# Altium footprint library 2.11-TQFP封装.PcbLib: 76 footprints (part 4 of 5) (continued)
## TQFP128 20x20_L [mm] "128脚，体宽：20x20mm, 脚距：0.5mm"
pads (128):
  oval 0.25x1.5 smd: 1(-7.75,-10.525) 2(-7.25,-10.525) 3(-6.75,-10.525) 4(-6.25,-10.525) 5(-5.75,-10.525) 6(-5.25,-10.525) 7(-4.75,-10.525) 8(-4.25,-10.525) 9(-3.75,-10.525) 10(-3.25,-10.525) 11(-2.75,-10.525) 12(-2.25,-10.525) 13(-1.75,-10.525) 14(-1.25,-10.525) 15(-0.75,-10.525) 16(-0.25,-10.525) 17(0.25,-10.525) 18(0.75,-10.525) 19(1.25,-10.525) 20(1.75,-10.525) 21(2.25,-10.525) 22(2.75,-10.525) 23(3.25,-10.525) 24(3.75,-10.525) 25(4.25,-10.525) 26(4.75,-10.525) 27(5.25,-10.525) 28(5.75,-10.525) 29(6.25,-10.525) 30(6.75,-10.525) 31(7.25,-10.525) 32(7.75,-10.525) 65(7.75,10.525) 66(7.25,10.525) 67(6.75,10.525) 68(6.25,10.525) 69(5.75,10.525) 70(5.25,10.525) 71(4.75,10.525) 72(4.25,10.525) 73(3.75,10.525) 74(3.25,10.525) 75(2.75,10.525) 76(2.25,10.525) 77(1.75,10.525) 78(1.25,10.525) 79(0.75,10.525) 80(0.25,10.525) 81(-0.25,10.525) 82(-0.75,10.525) 83(-1.25,10.525) 84(-1.75,10.525) 85(-2.25,10.525) 86(-2.75,10.525) 87(-3.25,10.525) 88(-3.75,10.525) 89(-4.25,10.525) 90(-4.75,10.525) 91(-5.25,10.525) 92(-5.75,10.525) 93(-6.25,10.525) 94(-6.75,10.525) 95(-7.25,10.525) 96(-7.75,10.525)
  oval 1.5x0.25 smd: 33(10.525,-7.75) 34(10.525,-7.25) 35(10.525,-6.75) 36(10.525,-6.25) 37(10.525,-5.75) 38(10.525,-5.25) 39(10.525,-4.75) 40(10.525,-4.25) 41(10.525,-3.75) 42(10.525,-3.25) 43(10.525,-2.75) 44(10.525,-2.25) 45(10.525,-1.75) 46(10.525,-1.25) 47(10.525,-0.75) 48(10.525,-0.25) 49(10.525,0.25) 50(10.525,0.75) 51(10.525,1.25) 52(10.525,1.75) 53(10.525,2.25) 54(10.525,2.75) 55(10.525,3.25) 56(10.525,3.75) 57(10.525,4.25) 58(10.525,4.75) 59(10.525,5.25) 60(10.525,5.75) 61(10.525,6.25) 62(10.525,6.75) 63(10.525,7.25) 64(10.525,7.75) 97(-10.525,7.75) 98(-10.525,7.25) 99(-10.525,6.75) 100(-10.525,6.25) 101(-10.525,5.75) 102(-10.525,5.25) 103(-10.525,4.75) 104(-10.525,4.25) 105(-10.525,3.75) 106(-10.525,3.25) 107(-10.525,2.75) 108(-10.525,2.25) 109(-10.525,1.75) 110(-10.525,1.25) 111(-10.525,0.75) 112(-10.525,0.25) 113(-10.525,-0.25) 114(-10.525,-0.75) 115(-10.525,-1.25) 116(-10.525,-1.75) 117(-10.525,-2.25) 118(-10.525,-2.75) 119(-10.525,-3.25) 120(-10.525,-3.75) 121(-10.525,-4.25) 122(-10.525,-4.75) 123(-10.525,-5.25) 124(-10.525,-5.75) 125(-10.525,-6.25) 126(-10.525,-6.75) 127(-10.525,-7.25) 128(-10.525,-7.75)
Top Overlay:
  circle w0.508: c-8.636,-10.795 r0.127
  circle w0.254: c-7.493,-7.493 r0.889
  lines w0.254: -9.144,-9.144 9.144,-9.144 9.144,9.144 -9.144,9.144 -9.144,-9.144
Mechanical 13:
  circle w0.1: c-8.222,-8.222 r1.016
  lines w0.1: -10,-10 -10,10 10,10 10,-10 -10,-10
Mechanical 15:
  circle w0.05: c0,0 r0.35
  lines w0.05: -0.5,0 0.5,0 ; 0,-0.5 0,0.5
  lines w0.1: -11.557,-11.557 11.557,-11.557 11.557,11.557 -11.557,11.557 -11.557,-11.557
3D body "TQFP128_20x20.STEP": height 1.05, standoff 0, extent -11.002,-11.002 11.002,11.002

## TQFP128 20x20_M [mm] "128脚，体宽：20x20mm, 脚距：0.5mm"
pads (128):
  oval 0.35x2.1 smd: 1(-7.75,-10.754) 2(-7.25,-10.754) 3(-6.75,-10.754) 4(-6.25,-10.754) 5(-5.75,-10.754) 6(-5.25,-10.754) 7(-4.75,-10.754) 8(-4.25,-10.754) 9(-3.75,-10.754) 10(-3.25,-10.754) 11(-2.75,-10.754) 12(-2.25,-10.754) 13(-1.75,-10.754) 14(-1.25,-10.754) 15(-0.75,-10.754) 16(-0.25,-10.754) 17(0.25,-10.754) 18(0.75,-10.754) 19(1.25,-10.754) 20(1.75,-10.754) 21(2.25,-10.754) 22(2.75,-10.754) 23(3.25,-10.754) 24(3.75,-10.754) 25(4.25,-10.754) 26(4.75,-10.754) 27(5.25,-10.754) 28(5.75,-10.754) 29(6.25,-10.754) 30(6.75,-10.754) 31(7.25,-10.754) 32(7.75,-10.754) 65(7.75,10.754) 66(7.25,10.754) 67(6.75,10.754) 68(6.25,10.754) 69(5.75,10.754) 70(5.25,10.754) 71(4.75,10.754) 72(4.25,10.754) 73(3.75,10.754) 74(3.25,10.754) 75(2.75,10.754) 76(2.25,10.754) 77(1.75,10.754) 78(1.25,10.754) 79(0.75,10.754) 80(0.25,10.754) 81(-0.25,10.754) 82(-0.75,10.754) 83(-1.25,10.754) 84(-1.75,10.754) 85(-2.25,10.754) 86(-2.75,10.754) 87(-3.25,10.754) 88(-3.75,10.754) 89(-4.25,10.754) 90(-4.75,10.754) 91(-5.25,10.754) 92(-5.75,10.754) 93(-6.25,10.754) 94(-6.75,10.754) 95(-7.25,10.754) 96(-7.75,10.754)
  oval 2.1x0.35 smd: 33(10.754,-7.75) 34(10.754,-7.25) 35(10.754,-6.75) 36(10.754,-6.25) 37(10.754,-5.75) 38(10.754,-5.25) 39(10.754,-4.75) 40(10.754,-4.25) 41(10.754,-3.75) 42(10.754,-3.25) 43(10.754,-2.75) 44(10.754,-2.25) 45(10.754,-1.75) 46(10.754,-1.25) 47(10.754,-0.75) 48(10.754,-0.25) 49(10.754,0.25) 50(10.754,0.75) 51(10.754,1.25) 52(10.754,1.75) 53(10.754,2.25) 54(10.754,2.75) 55(10.754,3.25) 56(10.754,3.75) 57(10.754,4.25) 58(10.754,4.75) 59(10.754,5.25) 60(10.754,5.75) 61(10.754,6.25) 62(10.754,6.75) 63(10.754,7.25) 64(10.754,7.75) 97(-10.754,7.75) 98(-10.754,7.25) 99(-10.754,6.75) 100(-10.754,6.25) 101(-10.754,5.75) 102(-10.754,5.25) 103(-10.754,4.75) 104(-10.754,4.25) 105(-10.754,3.75) 106(-10.754,3.25) 107(-10.754,2.75) 108(-10.754,2.25) 109(-10.754,1.75) 110(-10.754,1.25) 111(-10.754,0.75) 112(-10.754,0.25) 113(-10.754,-0.25) 114(-10.754,-0.75) 115(-10.754,-1.25) 116(-10.754,-1.75) 117(-10.754,-2.25) 118(-10.754,-2.75) 119(-10.754,-3.25) 120(-10.754,-3.75) 121(-10.754,-4.25) 122(-10.754,-4.75) 123(-10.754,-5.25) 124(-10.754,-5.75) 125(-10.754,-6.25) 126(-10.754,-6.75) 127(-10.754,-7.25) 128(-10.754,-7.75)
Top Overlay:
  circle w0.508: c-8.636,-11.303 r0.127
  circle w0.254: c-7.493,-7.493 r0.889
  lines w0.254: -9.144,-9.144 9.144,-9.144 9.144,9.144 -9.144,9.144 -9.144,-9.144
Mechanical 13:
  circle w0.1: c-8.222,-8.222 r1.016
  lines w0.1: -10,-10 -10,10 10,10 10,-10 -10,-10
Mechanical 15:
  circle w0.05: c0,0 r0.35
  lines w0.05: -0.5,0 0.5,0 ; 0,-0.5 0,0.5
  lines w0.1: -12.065,-12.065 12.065,-12.065 12.065,12.065 -12.065,12.065 -12.065,-12.065
3D body "TQFP128_20x20.STEP": height 1.05, standoff 0, extent -11.002,-11.002 11.002,11.002

## TQFP128 20x20_N [mm] "128脚，体宽：20x20mm, 脚距：0.5mm          淘宝ID:黄晶宝石"
pads (128):
  oval 0.3x1.8 smd: 1(-7.75,-10.576) 2(-7.25,-10.576) 3(-6.75,-10.576) 4(-6.25,-10.576) 5(-5.75,-10.576) 6(-5.25,-10.576) 7(-4.75,-10.576) 8(-4.25,-10.576) 9(-3.75,-10.576) 10(-3.25,-10.576) 11(-2.75,-10.576) 12(-2.25,-10.576) 13(-1.75,-10.576) 14(-1.25,-10.576) 15(-0.75,-10.576) 16(-0.25,-10.576) 17(0.25,-10.576) 18(0.75,-10.576) 19(1.25,-10.576) 20(1.75,-10.576) 21(2.25,-10.576) 22(2.75,-10.576) 23(3.25,-10.576) 24(3.75,-10.576) 25(4.25,-10.576) 26(4.75,-10.576) 27(5.25,-10.576) 28(5.75,-10.576) 29(6.25,-10.576) 30(6.75,-10.576) 31(7.25,-10.576) 32(7.75,-10.576) 65(7.75,10.576) 66(7.25,10.576) 67(6.75,10.576) 68(6.25,10.576) 69(5.75,10.576) 70(5.25,10.576) 71(4.75,10.576) 72(4.25,10.576) 73(3.75,10.576) 74(3.25,10.576) 75(2.75,10.576) 76(2.25,10.576) 77(1.75,10.576) 78(1.25,10.576) 79(0.75,10.576) 80(0.25,10.576) 81(-0.25,10.576) 82(-0.75,10.576) 83(-1.25,10.576) 84(-1.75,10.576) 85(-2.25,10.576) 86(-2.75,10.576) 87(-3.25,10.576) 88(-3.75,10.576) 89(-4.25,10.576) 90(-4.75,10.576) 91(-5.25,10.576) 92(-5.75,10.576) 93(-6.25,10.576) 94(-6.75,10.576) 95(-7.25,10.576) 96(-7.75,10.576)
  oval 1.8x0.3 smd: 33(10.576,-7.75) 34(10.576,-7.25) 35(10.576,-6.75) 36(10.576,-6.25) 37(10.576,-5.75) 38(10.576,-5.25) 39(10.576,-4.75) 40(10.576,-4.25) 41(10.576,-3.75) 42(10.576,-3.25) 43(10.576,-2.75) 44(10.576,-2.25) 45(10.576,-1.75) 46(10.576,-1.25) 47(10.576,-0.75) 48(10.576,-0.25) 49(10.576,0.25) 50(10.576,0.75) 51(10.576,1.25) 52(10.576,1.75) 53(10.576,2.25) 54(10.576,2.75) 55(10.576,3.25) 56(10.576,3.75) 57(10.576,4.25) 58(10.576,4.75) 59(10.576,5.25) 60(10.576,5.75) 61(10.576,6.25) 62(10.576,6.75) 63(10.576,7.25) 64(10.576,7.75) 97(-10.576,7.75) 98(-10.576,7.25) 99(-10.576,6.75) 100(-10.576,6.25) 101(-10.576,5.75) 102(-10.576,5.25) 103(-10.576,4.75) 104(-10.576,4.25) 105(-10.576,3.75) 106(-10.576,3.25) 107(-10.576,2.75) 108(-10.576,2.25) 109(-10.576,1.75) 110(-10.576,1.25) 111(-10.576,0.75) 112(-10.576,0.25) 113(-10.576,-0.25) 114(-10.576,-0.75) 115(-10.576,-1.25) 116(-10.576,-1.75) 117(-10.576,-2.25) 118(-10.576,-2.75) 119(-10.576,-3.25) 120(-10.576,-3.75) 121(-10.576,-4.25) 122(-10.576,-4.75) 123(-10.576,-5.25) 124(-10.576,-5.75) 125(-10.576,-6.25) 126(-10.576,-6.75) 127(-10.576,-7.25) 128(-10.576,-7.75)
Top Overlay:
  circle w0.508: c-8.636,-11.049 r0.127
  circle w0.254: c-7.493,-7.493 r0.889
  lines w0.254: -9.144,-9.144 -9.144,9.144 9.144,9.144 9.144,-9.144 -9.144,-9.144
Mechanical 13:
  circle w0.1: c-8.222,-8.222 r1.016
  lines w0.1: -10,-10 10,-10 10,10 -10,10 -10,-10
Mechanical 15:
  circle w0.05: c0,0 r0.35
  lines w0.05: -0.5,0 0.5,0 ; 0,-0.5 0,0.5
  lines w0.1: -11.684,-11.684 -11.684,11.684 11.684,11.684 11.684,-11.684 -11.684,-11.684
3D body "TQFP128_20x20.STEP": height 1.05, standoff 0, extent -11.002,-11.002 11.002,11.002

## TQFP128-14*14 [mm] "14x14mm, 0.4mm     封装库来自淘宝卖家 ID：黄晶宝石"
pads (128):
  oval 0.23x1.6 smd: 1(-6.2,-7.648) 2(-5.8,-7.648) 3(-5.4,-7.648) 4(-5,-7.648) 5(-4.6,-7.648) 6(-4.2,-7.648) 7(-3.8,-7.648) 8(-3.4,-7.648) 9(-3,-7.648) 10(-2.6,-7.648) 11(-2.2,-7.648) 12(-1.8,-7.648) 13(-1.4,-7.648) 14(-1,-7.648) 15(-0.6,-7.648) 16(-0.2,-7.648) 17(0.2,-7.648) 18(0.6,-7.648) 19(1,-7.648) 20(1.4,-7.648) 21(1.8,-7.648) 22(2.2,-7.648) 23(2.6,-7.648) 24(3,-7.648) 25(3.4,-7.648) 26(3.8,-7.648) 27(4.2,-7.648) 28(4.6,-7.648) 29(5,-7.648) 30(5.4,-7.648) 31(5.8,-7.648) 32(6.2,-7.648) 65(6.2,7.653) 66(5.8,7.653) 67(5.4,7.653) 68(5,7.653) 69(4.6,7.653) 70(4.2,7.653) 71(3.8,7.653) 72(3.4,7.653) 73(3,7.653) 74(2.6,7.653) 75(2.2,7.653) 76(1.8,7.653) 77(1.4,7.653) 78(1,7.653) 79(0.6,7.653) 80(0.2,7.653) 81(-0.2,7.653) 82(-0.6,7.653) 83(-1,7.653) 84(-1.4,7.653) 85(-1.8,7.653) 86(-2.2,7.653) 87(-2.6,7.653) 88(-3,7.653) 89(-3.4,7.653) 90(-3.8,7.653) 91(-4.2,7.653) 92(-4.6,7.653) 93(-5,7.653) 94(-5.4,7.653) 95(-5.8,7.653) 96(-6.2,7.653)
  oval 1.6x0.23 smd: 33(7.651,-6.198) 34(7.651,-5.798) 35(7.651,-5.398) 36(7.651,-4.998) 37(7.651,-4.598) 38(7.651,-4.198) 39(7.651,-3.798) 40(7.651,-3.398) 41(7.651,-2.998) 42(7.651,-2.598) 43(7.651,-2.198) 44(7.651,-1.798) 45(7.651,-1.398) 46(7.651,-0.998) 47(7.651,-0.598) 48(7.651,-0.198) 49(7.651,0.202) 50(7.651,0.602) 51(7.651,1.002) 52(7.651,1.402) 53(7.651,1.802) 54(7.651,2.202) 55(7.651,2.602) 56(7.651,3.002) 57(7.651,3.402) 58(7.651,3.802) 59(7.651,4.202) 60(7.651,4.602) 61(7.651,5.002) 62(7.651,5.402) 63(7.651,5.802) 64(7.651,6.202) 97(-7.651,6.202) 98(-7.651,5.802) 99(-7.651,5.402) 100(-7.651,5.002) 101(-7.651,4.602) 102(-7.651,4.202) 103(-7.651,3.802) 104(-7.651,3.402) 105(-7.651,3.002) 106(-7.651,2.602) 107(-7.651,2.202) 108(-7.651,1.802) 109(-7.651,1.402) 110(-7.651,1.002) 111(-7.651,0.602) 112(-7.651,0.202) 113(-7.651,-0.198) 114(-7.651,-0.598) 115(-7.651,-0.998) 116(-7.651,-1.398) 117(-7.651,-1.798) 118(-7.651,-2.198) 119(-7.651,-2.598) 120(-7.651,-2.998) 121(-7.651,-3.398) 122(-7.651,-3.798) 123(-7.651,-4.198) 124(-7.651,-4.598) 125(-7.651,-4.998) 126(-7.651,-5.398) 127(-7.651,-5.798) 128(-7.651,-6.198)
Top Overlay:
  circle w0.508: c-6.985,-8.001 r0.127
  lines w0.254: -6.096,-6.094 6.096,-6.094 6.096,6.098 -6.096,6.098 -6.096,-6.094
3D body "TQFP128_14x14.STEP": height 1.05, standoff 0, extent -8.002,-8.002 8.002,8.002

## TQFP128-20*20 [mm] "20x20mm, 0.5mm      封装库来自淘宝卖家 ID：黄晶宝石"
pads (128):
  oval 0.3x1.8 smd: 1(-7.75,-10.576) 2(-7.25,-10.576) 3(-6.75,-10.576) 4(-6.25,-10.576) 5(-5.75,-10.576) 6(-5.25,-10.576) 7(-4.75,-10.576) 8(-4.25,-10.576) 9(-3.75,-10.576) 10(-3.25,-10.576) 11(-2.75,-10.576) 12(-2.25,-10.576) 13(-1.75,-10.576) 14(-1.25,-10.576) 15(-0.75,-10.576) 16(-0.25,-10.576) 17(0.25,-10.576) 18(0.75,-10.576) 19(1.25,-10.576) 20(1.75,-10.576) 21(2.25,-10.576) 22(2.75,-10.576) 23(3.25,-10.576) 24(3.75,-10.576) 25(4.25,-10.576) 26(4.75,-10.576) 27(5.25,-10.576) 28(5.75,-10.576) 29(6.25,-10.576) 30(6.75,-10.576) 31(7.25,-10.576) 32(7.75,-10.576) 65(7.75,10.576) 66(7.25,10.576) 67(6.75,10.576) 68(6.25,10.576) 69(5.75,10.576) 70(5.25,10.576) 71(4.75,10.576) 72(4.25,10.576) 73(3.75,10.576) 74(3.25,10.576) 75(2.75,10.576) 76(2.25,10.576) 77(1.75,10.576) 78(1.25,10.576) 79(0.75,10.576) 80(0.25,10.576) 81(-0.25,10.576) 82(-0.75,10.576) 83(-1.25,10.576) 84(-1.75,10.576) 85(-2.25,10.576) 86(-2.75,10.576) 87(-3.25,10.576) 88(-3.75,10.576) 89(-4.25,10.576) 90(-4.75,10.576) 91(-5.25,10.576) 92(-5.75,10.576) 93(-6.25,10.576) 94(-6.75,10.576) 95(-7.25,10.576) 96(-7.75,10.576)
  oval 1.8x0.3 smd: 33(10.576,-7.75) 34(10.576,-7.25) 35(10.576,-6.75) 36(10.576,-6.25) 37(10.576,-5.75) 38(10.576,-5.25) 39(10.576,-4.75) 40(10.576,-4.25) 41(10.576,-3.75) 42(10.576,-3.25) 43(10.576,-2.75) 44(10.576,-2.25) 45(10.576,-1.75) 46(10.576,-1.25) 47(10.576,-0.75) 48(10.576,-0.25) 49(10.576,0.25) 50(10.576,0.75) 51(10.576,1.25) 52(10.576,1.75) 53(10.576,2.25) 54(10.576,2.75) 55(10.576,3.25) 56(10.576,3.75) 57(10.576,4.25) 58(10.576,4.75) 59(10.576,5.25) 60(10.576,5.75) 61(10.576,6.25) 62(10.576,6.75) 63(10.576,7.25) 64(10.576,7.75) 97(-10.576,7.75) 98(-10.576,7.25) 99(-10.576,6.75) 100(-10.576,6.25) 101(-10.576,5.75) 102(-10.576,5.25) 103(-10.576,4.75) 104(-10.576,4.25) 105(-10.576,3.75) 106(-10.576,3.25) 107(-10.576,2.75) 108(-10.576,2.25) 109(-10.576,1.75) 110(-10.576,1.25) 111(-10.576,0.75) 112(-10.576,0.25) 113(-10.576,-0.25) 114(-10.576,-0.75) 115(-10.576,-1.25) 116(-10.576,-1.75) 117(-10.576,-2.25) 118(-10.576,-2.75) 119(-10.576,-3.25) 120(-10.576,-3.75) 121(-10.576,-4.25) 122(-10.576,-4.75) 123(-10.576,-5.25) 124(-10.576,-5.75) 125(-10.576,-6.25) 126(-10.576,-6.75) 127(-10.576,-7.25) 128(-10.576,-7.75)
Top Overlay:
  circle w0.508: c-8.636,-11.049 r0.127
  lines w0.254: -9.144,-9.144 9.144,-9.144 9.144,9.144 -9.144,9.144 -9.144,-9.144
3D body "TQFP128_20x20.STEP": height 1.05, standoff 0, extent -11.002,-11.002 11.002,11.002

## TQFP144 20x20_L [mm] "144脚，体宽：20x20mm, 脚距：0.5mm"
height 1.6
pads (144):
  oval 0.25x1.5 smd: 1(-8.75,-10.525) 2(-8.25,-10.525) 3(-7.75,-10.525) 4(-7.25,-10.525) 5(-6.75,-10.525) 6(-6.25,-10.525) 7(-5.75,-10.525) 8(-5.25,-10.525) 9(-4.75,-10.525) 10(-4.25,-10.525) 11(-3.75,-10.525) 12(-3.25,-10.525) 13(-2.75,-10.525) 14(-2.25,-10.525) 15(-1.75,-10.525) 16(-1.25,-10.525) 17(-0.75,-10.525) 18(-0.25,-10.525) 19(0.25,-10.525) 20(0.75,-10.525) 21(1.25,-10.525) 22(1.75,-10.525) 23(2.25,-10.525) 24(2.75,-10.525) 25(3.25,-10.525) 26(3.75,-10.525) 27(4.25,-10.525) 28(4.75,-10.525) 29(5.25,-10.525) 30(5.75,-10.525) 31(6.25,-10.525) 32(6.75,-10.525) 33(7.25,-10.525) 34(7.75,-10.525) 35(8.25,-10.525) 36(8.75,-10.525) 73(8.75,10.525) 74(8.25,10.525) 75(7.75,10.525) 76(7.25,10.525) 77(6.75,10.525) 78(6.25,10.525) 79(5.75,10.525) 80(5.25,10.525) 81(4.75,10.525) 82(4.25,10.525) 83(3.75,10.525) 84(3.25,10.525) 85(2.75,10.525) 86(2.25,10.525) 87(1.75,10.525) 88(1.25,10.525) 89(0.75,10.525) 90(0.25,10.525) 91(-0.25,10.525) 92(-0.75,10.525) 93(-1.25,10.525) 94(-1.75,10.525) 95(-2.25,10.525) 96(-2.75,10.525) 97(-3.25,10.525) 98(-3.75,10.525) 99(-4.25,10.525) 100(-4.75,10.525) 101(-5.25,10.525) 102(-5.75,10.525) 103(-6.25,10.525) 104(-6.75,10.525) 105(-7.25,10.525) 106(-7.75,10.525) 107(-8.25,10.525) 108(-8.75,10.525)
  oval 1.5x0.25 smd: 37(10.525,-8.75) 38(10.525,-8.25) 39(10.525,-7.75) 40(10.525,-7.25) 41(10.525,-6.75) 42(10.525,-6.25) 43(10.525,-5.75) 44(10.525,-5.25) 45(10.525,-4.75) 46(10.525,-4.25) 47(10.525,-3.75) 48(10.525,-3.25) 49(10.525,-2.75) 50(10.525,-2.25) 51(10.525,-1.75) 52(10.525,-1.25) 53(10.525,-0.75) 54(10.525,-0.25) 55(10.525,0.25) 56(10.525,0.75) 57(10.525,1.25) 58(10.525,1.75) 59(10.525,2.25) 60(10.525,2.75) 61(10.525,3.25) 62(10.525,3.75) 63(10.525,4.25) 64(10.525,4.75) 65(10.525,5.25) 66(10.525,5.75) 67(10.525,6.25) 68(10.525,6.75) 69(10.525,7.25) 70(10.525,7.75) 71(10.525,8.25) 72(10.525,8.75) 109(-10.525,8.75) 110(-10.525,8.25) 111(-10.525,7.75) 112(-10.525,7.25) 113(-10.525,6.75) 114(-10.525,6.25) 115(-10.525,5.75) 116(-10.525,5.25) 117(-10.525,4.75) 118(-10.525,4.25) 119(-10.525,3.75) 120(-10.525,3.25) 121(-10.525,2.75) 122(-10.525,2.25) 123(-10.525,1.75) 124(-10.525,1.25) 125(-10.525,0.75) 126(-10.525,0.25) 127(-10.525,-0.25) 128(-10.525,-0.75) 129(-10.525,-1.25) 130(-10.525,-1.75) 131(-10.525,-2.25) 132(-10.525,-2.75) 133(-10.525,-3.25) 134(-10.525,-3.75) 135(-10.525,-4.25) 136(-10.525,-4.75) 137(-10.525,-5.25) 138(-10.525,-5.75) 139(-10.525,-6.25) 140(-10.525,-6.75) 141(-10.525,-7.25) 142(-10.525,-7.75) 143(-10.525,-8.25) 144(-10.525,-8.75)
Top Overlay:
  circle w0.508: c-9.652,-10.795 r0.127
  circle w0.254: c-7.366,-7.366 r0.889
  lines w0.254: -8.89,-8.89 8.89,-8.89 8.89,8.89 -8.89,8.89 -8.89,-8.89
Mechanical 13:
  circle w0.1: c-9.1,-9.1 r0.5
  lines w0.1: -10,-10 10,-10 10,10 -10,10 -10,-10
Mechanical 15:
  circle w0.05: c0,0 r0.35
  lines w0.05: -0.5,0 0.5,0 ; 0,-0.5 0,0.5
  lines w0.1: -11.557,-11.557 11.557,-11.557 11.557,11.557 -11.557,11.557 -11.557,-11.557
3D body "TQFP144_20x20.STEP": height 1.05, standoff 0, extent -11.002,-11.002 11.002,11.002

## TQFP144 20x20_M [mm] "144脚，体宽：20x20mm, 脚距：0.5mm  淘宝ID:黄晶宝石"
height 1.6
pads (144):
  oval 0.35x2.1 smd: 1(-8.75,-10.754) 2(-8.25,-10.754) 3(-7.75,-10.754) 4(-7.25,-10.754) 5(-6.75,-10.754) 6(-6.25,-10.754) 7(-5.75,-10.754) 8(-5.25,-10.754) 9(-4.75,-10.754) 10(-4.25,-10.754) 11(-3.75,-10.754) 12(-3.25,-10.754) 13(-2.75,-10.754) 14(-2.25,-10.754) 15(-1.75,-10.754) 16(-1.25,-10.754) 17(-0.75,-10.754) 18(-0.25,-10.754) 19(0.25,-10.754) 20(0.75,-10.754) 21(1.25,-10.754) 22(1.75,-10.754) 23(2.25,-10.754) 24(2.75,-10.754) 25(3.25,-10.754) 26(3.75,-10.754) 27(4.25,-10.754) 28(4.75,-10.754) 29(5.25,-10.754) 30(5.75,-10.754) 31(6.25,-10.754) 32(6.75,-10.754) 33(7.25,-10.754) 34(7.75,-10.754) 35(8.25,-10.754) 36(8.75,-10.754) 73(8.75,10.754) 74(8.25,10.754) 75(7.75,10.754) 76(7.25,10.754) 77(6.75,10.754) 78(6.25,10.754) 79(5.75,10.754) 80(5.25,10.754) 81(4.75,10.754) 82(4.25,10.754) 83(3.75,10.754) 84(3.25,10.754) 85(2.75,10.754) 86(2.25,10.754) 87(1.75,10.754) 88(1.25,10.754) 89(0.75,10.754) 90(0.25,10.754) 91(-0.25,10.754) 92(-0.75,10.754) 93(-1.25,10.754) 94(-1.75,10.754) 95(-2.25,10.754) 96(-2.75,10.754) 97(-3.25,10.754) 98(-3.75,10.754) 99(-4.25,10.754) 100(-4.75,10.754) 101(-5.25,10.754) 102(-5.75,10.754) 103(-6.25,10.754) 104(-6.75,10.754) 105(-7.25,10.754) 106(-7.75,10.754) 107(-8.25,10.754) 108(-8.75,10.754)
  oval 2.1x0.35 smd: 37(10.754,-8.75) 38(10.754,-8.25) 39(10.754,-7.75) 40(10.754,-7.25) 41(10.754,-6.75) 42(10.754,-6.25) 43(10.754,-5.75) 44(10.754,-5.25) 45(10.754,-4.75) 46(10.754,-4.25) 47(10.754,-3.75) 48(10.754,-3.25) 49(10.754,-2.75) 50(10.754,-2.25) 51(10.754,-1.75) 52(10.754,-1.25) 53(10.754,-0.75) 54(10.754,-0.25) 55(10.754,0.25) 56(10.754,0.75) 57(10.754,1.25) 58(10.754,1.75) 59(10.754,2.25) 60(10.754,2.75) 61(10.754,3.25) 62(10.754,3.75) 63(10.754,4.25) 64(10.754,4.75) 65(10.754,5.25) 66(10.754,5.75) 67(10.754,6.25) 68(10.754,6.75) 69(10.754,7.25) 70(10.754,7.75) 71(10.754,8.25) 72(10.754,8.75) 109(-10.754,8.75) 110(-10.754,8.25) 111(-10.754,7.75) 112(-10.754,7.25) 113(-10.754,6.75) 114(-10.754,6.25) 115(-10.754,5.75) 116(-10.754,5.25) 117(-10.754,4.75) 118(-10.754,4.25) 119(-10.754,3.75) 120(-10.754,3.25) 121(-10.754,2.75) 122(-10.754,2.25) 123(-10.754,1.75) 124(-10.754,1.25) 125(-10.754,0.75) 126(-10.754,0.25) 127(-10.754,-0.25) 128(-10.754,-0.75) 129(-10.754,-1.25) 130(-10.754,-1.75) 131(-10.754,-2.25) 132(-10.754,-2.75) 133(-10.754,-3.25) 134(-10.754,-3.75) 135(-10.754,-4.25) 136(-10.754,-4.75) 137(-10.754,-5.25) 138(-10.754,-5.75) 139(-10.754,-6.25) 140(-10.754,-6.75) 141(-10.754,-7.25) 142(-10.754,-7.75) 143(-10.754,-8.25) 144(-10.754,-8.75)
Top Overlay:
  circle w0.254: c-7.366,-7.366 r0.889
  circle w0.508: c-9.652,-11.303 r0.127
  lines w0.254: -8.89,-8.89 -8.89,8.89 8.89,8.89 8.89,-8.89 -8.89,-8.89
Mechanical 13:
  circle w0.1: c-9.1,-9.1 r0.5
  lines w0.1: -10,-10 -10,10 10,10 10,-10 -10,-10
Mechanical 15:
  circle w0.05: c0,0 r0.35
  lines w0.05: -0.5,0 0.5,0 ; 0,-0.5 0,0.5
  lines w0.1: -12.065,-12.065 -12.065,12.065 12.065,12.065 12.065,-12.065 -12.065,-12.065
3D body "TQFP144_20x20.STEP": height 1.05, standoff 0, extent -11.002,-11.002 11.002,11.002

## TQFP144 20x20_N [mm] "144脚，体宽：20x20mm, 脚距：0.5mm"
height 1.6
pads (144):
  oval 0.3x1.8 smd: 1(-8.75,-10.576) 2(-8.25,-10.576) 3(-7.75,-10.576) 4(-7.25,-10.576) 5(-6.75,-10.576) 6(-6.25,-10.576) 7(-5.75,-10.576) 8(-5.25,-10.576) 9(-4.75,-10.576) 10(-4.25,-10.576) 11(-3.75,-10.576) 12(-3.25,-10.576) 13(-2.75,-10.576) 14(-2.25,-10.576) 15(-1.75,-10.576) 16(-1.25,-10.576) 17(-0.75,-10.576) 18(-0.25,-10.576) 19(0.25,-10.576) 20(0.75,-10.576) 21(1.25,-10.576) 22(1.75,-10.576) 23(2.25,-10.576) 24(2.75,-10.576) 25(3.25,-10.576) 26(3.75,-10.576) 27(4.25,-10.576) 28(4.75,-10.576) 29(5.25,-10.576) 30(5.75,-10.576) 31(6.25,-10.576) 32(6.75,-10.576) 33(7.25,-10.576) 34(7.75,-10.576) 35(8.25,-10.576) 36(8.75,-10.576) 73(8.75,10.576) 74(8.25,10.576) 75(7.75,10.576) 76(7.25,10.576) 77(6.75,10.576) 78(6.25,10.576) 79(5.75,10.576) 80(5.25,10.576) 81(4.75,10.576) 82(4.25,10.576) 83(3.75,10.576) 84(3.25,10.576) 85(2.75,10.576) 86(2.25,10.576) 87(1.75,10.576) 88(1.25,10.576) 89(0.75,10.576) 90(0.25,10.576) 91(-0.25,10.576) 92(-0.75,10.576) 93(-1.25,10.576) 94(-1.75,10.576) 95(-2.25,10.576) 96(-2.75,10.576) 97(-3.25,10.576) 98(-3.75,10.576) 99(-4.25,10.576) 100(-4.75,10.576) 101(-5.25,10.576) 102(-5.75,10.576) 103(-6.25,10.576) 104(-6.75,10.576) 105(-7.25,10.576) 106(-7.75,10.576) 107(-8.25,10.576) 108(-8.75,10.576)
  oval 1.8x0.3 smd: 37(10.576,-8.75) 38(10.576,-8.25) 39(10.576,-7.75) 40(10.576,-7.25) 41(10.576,-6.75) 42(10.576,-6.25) 43(10.576,-5.75) 44(10.576,-5.25) 45(10.576,-4.75) 46(10.576,-4.25) 47(10.576,-3.75) 48(10.576,-3.25) 49(10.576,-2.75) 50(10.576,-2.25) 51(10.576,-1.75) 52(10.576,-1.25) 53(10.576,-0.75) 54(10.576,-0.25) 55(10.576,0.25) 56(10.576,0.75) 57(10.576,1.25) 58(10.576,1.75) 59(10.576,2.25) 60(10.576,2.75) 61(10.576,3.25) 62(10.576,3.75) 63(10.576,4.25) 64(10.576,4.75) 65(10.576,5.25) 66(10.576,5.75) 67(10.576,6.25) 68(10.576,6.75) 69(10.576,7.25) 70(10.576,7.75) 71(10.576,8.25) 72(10.576,8.75) 109(-10.576,8.75) 110(-10.576,8.25) 111(-10.576,7.75) 112(-10.576,7.25) 113(-10.576,6.75) 114(-10.576,6.25) 115(-10.576,5.75) 116(-10.576,5.25) 117(-10.576,4.75) 118(-10.576,4.25) 119(-10.576,3.75) 120(-10.576,3.25) 121(-10.576,2.75) 122(-10.576,2.25) 123(-10.576,1.75) 124(-10.576,1.25) 125(-10.576,0.75) 126(-10.576,0.25) 127(-10.576,-0.25) 128(-10.576,-0.75) 129(-10.576,-1.25) 130(-10.576,-1.75) 131(-10.576,-2.25) 132(-10.576,-2.75) 133(-10.576,-3.25) 134(-10.576,-3.75) 135(-10.576,-4.25) 136(-10.576,-4.75) 137(-10.576,-5.25) 138(-10.576,-5.75) 139(-10.576,-6.25) 140(-10.576,-6.75) 141(-10.576,-7.25) 142(-10.576,-7.75) 143(-10.576,-8.25) 144(-10.576,-8.75)
Top Overlay:
  circle w0.508: c-9.652,-11.049 r0.127
  circle w0.254: c-7.366,-7.366 r0.889
  lines w0.254: -8.89,-8.89 8.89,-8.89 8.89,8.89 -8.89,8.89 -8.89,-8.89
Mechanical 13:
  circle w0.1: c-9.1,-9.1 r0.5
  lines w0.1: -10,-10 10,-10 10,10 -10,10 -10,-10
Mechanical 15:
  circle w0.05: c0,0 r0.35
  lines w0.05: -0.5,0 0.5,0 ; 0,-0.5 0,0.5
  lines w0.1: -11.684,-11.684 11.684,-11.684 11.684,11.684 -11.684,11.684 -11.684,-11.684
3D body "TQFP144_20x20.STEP": height 1.05, standoff 0, extent -11.002,-11.002 11.002,11.002

## TQFP144-20*20 [mm] "20x20mm, 0.5mm      封装库来自淘宝卖家 ID：黄晶宝石"
pads (144):
  oval 0.3x1.8 smd: 1(-8.75,-10.576) 2(-8.25,-10.576) 3(-7.75,-10.576) 4(-7.25,-10.576) 5(-6.75,-10.576) 6(-6.25,-10.576) 7(-5.75,-10.576) 8(-5.25,-10.576) 9(-4.75,-10.576) 10(-4.25,-10.576) 11(-3.75,-10.576) 12(-3.25,-10.576) 13(-2.75,-10.576) 14(-2.25,-10.576) 15(-1.75,-10.576) 16(-1.25,-10.576) 17(-0.75,-10.576) 18(-0.25,-10.576) 19(0.25,-10.576) 20(0.75,-10.576) 21(1.25,-10.576) 22(1.75,-10.576) 23(2.25,-10.576) 24(2.75,-10.576) 25(3.25,-10.576) 26(3.75,-10.576) 27(4.25,-10.576) 28(4.75,-10.576) 29(5.25,-10.576) 30(5.75,-10.576) 31(6.25,-10.576) 32(6.75,-10.576) 33(7.25,-10.576) 34(7.75,-10.576) 35(8.25,-10.576) 36(8.75,-10.576) 73(8.75,10.576) 74(8.25,10.576) 75(7.75,10.576) 76(7.25,10.576) 77(6.75,10.576) 78(6.25,10.576) 79(5.75,10.576) 80(5.25,10.576) 81(4.75,10.576) 82(4.25,10.576) 83(3.75,10.576) 84(3.25,10.576) 85(2.75,10.576) 86(2.25,10.576) 87(1.75,10.576) 88(1.25,10.576) 89(0.75,10.576) 90(0.25,10.576) 91(-0.25,10.576) 92(-0.75,10.576) 93(-1.25,10.576) 94(-1.75,10.576) 95(-2.25,10.576) 96(-2.75,10.576) 97(-3.25,10.576) 98(-3.75,10.576) 99(-4.25,10.576) 100(-4.75,10.576) 101(-5.25,10.576) 102(-5.75,10.576) 103(-6.25,10.576) 104(-6.75,10.576) 105(-7.25,10.576) 106(-7.75,10.576) 107(-8.25,10.576) 108(-8.75,10.576)
  oval 1.8x0.3 smd: 37(10.576,-8.75) 38(10.576,-8.25) 39(10.576,-7.75) 40(10.576,-7.25) 41(10.576,-6.75) 42(10.576,-6.25) 43(10.576,-5.75) 44(10.576,-5.25) 45(10.576,-4.75) 46(10.576,-4.25) 47(10.576,-3.75) 48(10.576,-3.25) 49(10.576,-2.75) 50(10.576,-2.25) 51(10.576,-1.75) 52(10.576,-1.25) 53(10.576,-0.75) 54(10.576,-0.25) 55(10.576,0.25) 56(10.576,0.75) 57(10.576,1.25) 58(10.576,1.75) 59(10.576,2.25) 60(10.576,2.75) 61(10.576,3.25) 62(10.576,3.75) 63(10.576,4.25) 64(10.576,4.75) 65(10.576,5.25) 66(10.576,5.75) 67(10.576,6.25) 68(10.576,6.75) 69(10.576,7.25) 70(10.576,7.75) 71(10.576,8.25) 72(10.576,8.75) 109(-10.576,8.75) 110(-10.576,8.25) 111(-10.576,7.75) 112(-10.576,7.25) 113(-10.576,6.75) 114(-10.576,6.25) 115(-10.576,5.75) 116(-10.576,5.25) 117(-10.576,4.75) 118(-10.576,4.25) 119(-10.576,3.75) 120(-10.576,3.25) 121(-10.576,2.75) 122(-10.576,2.25) 123(-10.576,1.75) 124(-10.576,1.25) 125(-10.576,0.75) 126(-10.576,0.25) 127(-10.576,-0.25) 128(-10.576,-0.75) 129(-10.576,-1.25) 130(-10.576,-1.75) 131(-10.576,-2.25) 132(-10.576,-2.75) 133(-10.576,-3.25) 134(-10.576,-3.75) 135(-10.576,-4.25) 136(-10.576,-4.75) 137(-10.576,-5.25) 138(-10.576,-5.75) 139(-10.576,-6.25) 140(-10.576,-6.75) 141(-10.576,-7.25) 142(-10.576,-7.75) 143(-10.576,-8.25) 144(-10.576,-8.75)
Top Overlay:
  circle w0.508: c-9.652,-11.049 r0.127
  lines w0.254: -8.89,-8.89 8.89,-8.89 8.89,8.89 -8.89,8.89 -8.89,-8.89
3D body "TQFP144_20x20.STEP": height 1.05, standoff 0, extent -11.002,-11.002 11.002,11.002